# Altium footprint library Austindetz_CM4_Board_v1.0.PcbLib: 102 footprints (part 3 of 7)
Each footprint in its own frame and in the unit in brackets; x right, y up, seen from the top. Pads: shape width x height; smd on the part's side, far side on the other; paste and mask are expansions set on the pad; w line width, h text height; cw(c..) or ccw(c..) is an arc to the next point about the centre after c.
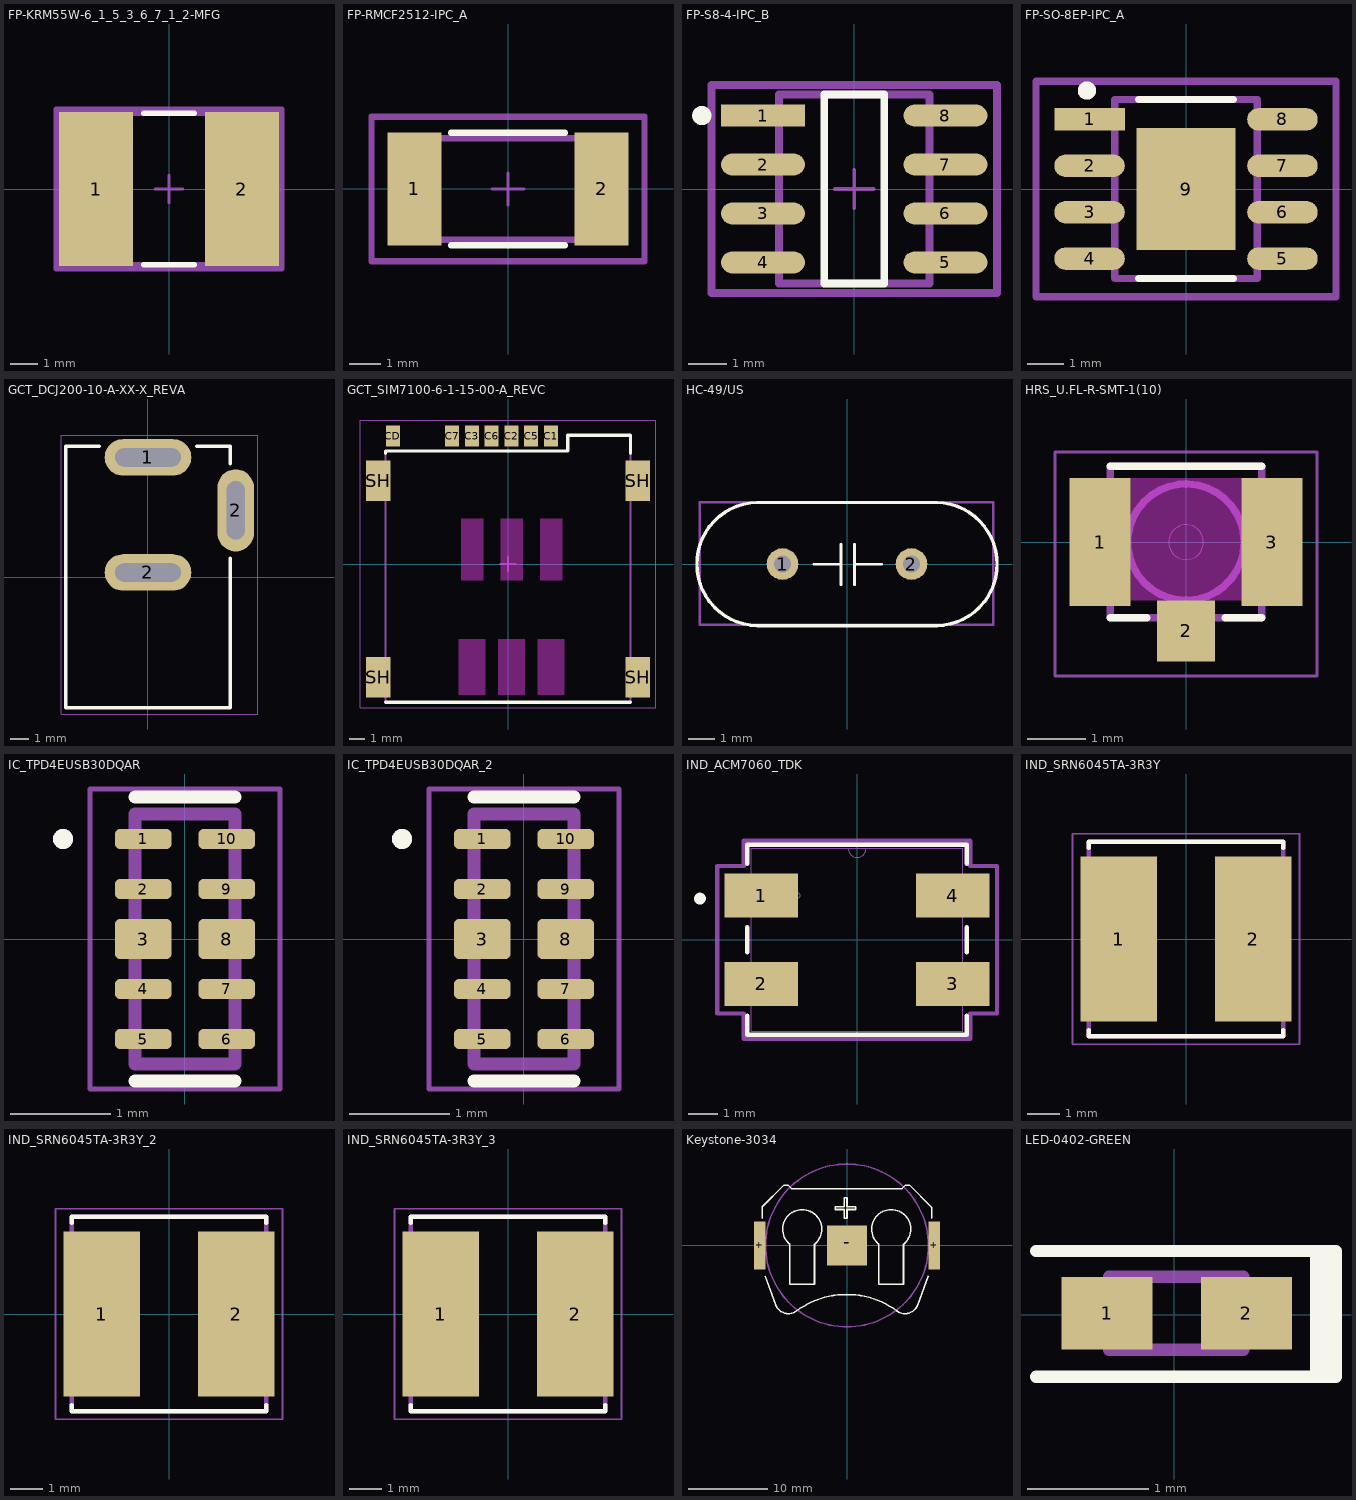
[diagram p2: the footprints below, top view; thin cyan lines are the x and y axes]

## FP-KRM55W-6_1_5_3_6_7_1_2-MFG [mm]
pads (2):
  rect 2.7x5.6 smd paste+0 mask+0: 1(-2.65,0) 2(2.65,0)
Top Overlay:
  lines w0.2: -0.925,-2.75 0.925,-2.75 ; -0.925,2.75 0.925,2.75
Top 3D Body:
  lines w0.2: -3.25,-2.75 -3.25,2.75 3.25,2.75 3.25,-2.75 -3.25,-2.75
Top Assembly:
  lines w0.2: -4.1,-2.9 -4.1,2.9 4.1,2.9 4.1,-2.9 -4.1,-2.9
  text ".Designator" at 0,0.188 h1
Top Courtyard:
  lines w0.2: -4.1,-2.9 -4.1,2.9 4.1,2.9 4.1,-2.9 -4.1,-2.9
Top Component Center:
  lines w0.1: -0.5,0 0.5,0 ; 0,-0.5 0,0.5
3D body "Cap_Murata_KRM55WR72A226MH01L_eec.STEP": height 6.7, standoff 0, extent -3.05,-2.65 3.05,2.65

## FP-RMCF2512-IPC_A [mm]
pads (2):
  rect 1.704x3.555 smd paste+0 mask+0: 1(-2.951,0) 2(2.951,0)
Top Overlay:
  lines w0.2: -1.799,-1.777 1.799,-1.777 ; -1.799,1.777 1.799,1.777
Top 3D Body:
  lines w0.2: -3.15,-1.6 -3.15,1.6 3.15,1.6 3.15,-1.6 -3.15,-1.6
Top Assembly:
  lines w0.2: -4.303,-2.277 -4.303,2.277 4.303,2.277 4.303,-2.277 -4.303,-2.277
  text ".Designator" at 0,0.188 h1
Top Courtyard:
  lines w0.2: -4.303,-2.277 -4.303,2.277 4.303,2.277 4.303,-2.277 -4.303,-2.277
Top Component Center:
  lines w0.1: -0.5,0 0.5,0 ; 0,-0.5 0,0.5
3D body "Res_Stackpole_RMCF2512FT10M0_eec.STEP": height 0.25, standoff 0, extent -4.303,-2.277 4.303,2.277

## FP-S8-4-IPC_B [mm]
pads (8):
  rect 2.174x0.567 smd paste+0 mask+0: 1(-2.366,1.905)
  rrect100% 2.174x0.567 smd paste+0 mask+0: 2(-2.366,0.635) 3(-2.366,-0.635) 4(-2.366,-1.905) 5(2.366,-1.905) 6(2.366,-0.635) 7(2.366,0.635) 8(2.366,1.905)
Top Overlay:
  circle w0.25: c-3.953,1.905 r0.125
  lines w0.2: -0.779,-2.45 0.779,-2.45 0.779,2.45 -0.779,2.45 -0.779,-2.45
Top 3D Body:
  lines w0.2: -1.95,-2.45 1.95,-2.45 1.95,2.45 -1.95,2.45 -1.95,-2.45
Top Assembly:
  lines w0.2: -3.703,-2.7 3.703,-2.7 3.703,2.7 -3.703,2.7 -3.703,-2.7
  text ".Designator" at 0,0.188 h1
Top Courtyard:
  lines w0.2: -3.703,-2.7 3.703,-2.7 3.703,2.7 -3.703,2.7 -3.703,-2.7
Top Component Center:
  lines w0.1: -0.5,0 0.5,0 ; 0,-0.5 0,0.5
3D body "IC_Maxim_MAX31855KASA+_eec.STEP": height 0.25, standoff 0, extent -3.703,-2.7 3.703,2.7

## FP-SO-8EP-IPC_A [mm]
pads (9):
  rect 1.93x0.612 smd paste+0 mask+0: 1(-2.641,1.905)
  rrect100% 1.93x0.612 smd paste+0 mask+0: 2(-2.641,0.635) 3(-2.641,-0.635) 4(-2.641,-1.905) 5(2.641,-1.905) 6(2.641,-0.635) 7(2.641,0.635) 8(2.641,1.905)
  rect 2.71x3.35 smd paste-1000 mask+0: 9(0,0)
Top Overlay:
  circle w0.25: c-2.712,2.694 r0.125
  lines w0.2: -1.301,-2.45 1.301,-2.45 ; -1.301,2.45 1.301,2.45
Top Paste:
  rectangle: -0.806,-1.126 0.806,1.126
Top 3D Body:
  lines w0.2: -1.95,-2.45 1.95,-2.45 1.95,2.45 -1.95,2.45 -1.95,-2.45
Top Assembly:
  lines w0.2: -4.106,-2.95 4.106,-2.95 4.106,2.95 -4.106,2.95 -4.106,-2.95
  text ".Designator" at 0,0 h1
Top Courtyard:
  lines w0.2: -4.106,-2.95 4.106,-2.95 4.106,2.95 -4.106,2.95 -4.106,-2.95
Top Component Center:
  lines w0.1: -0.5,0 0.5,0 ; 0,-0.5 0,0.5
3D body "IC_Diodes_Inc_AP6503SP-13_eec.STEP": height 1.63, standoff 0, extent -3,-2.45 3,2.45

## GCT_DCJ200-10-A-XX-X_REVA [mm]
pads (3):
  oval 4.75x2 hole 1 slot 3.6 at 0 deg unplated: 1(0,6.55) 2(0,0.25)
  oval 2x4.5 hole 1 slot 3.2 at 90 deg unplated: 2(4.8,3.65)
Top Overlay:
  lines w0.2: -2.685,7.15 -4.5,7.15 -4.5,-7.15 4.5,-7.15 4.5,1.016 ; 2.683,7.15 4.495,7.15 4.495,6.212
Mechanical 15:
  lines w0.05: -4.75,-7.5 -4.75,7.75 6,7.75 6,-7.5 -4.75,-7.5
3D body "step_temp.STEP": height 11, standoff -3.5, extent -4.5,-7.131 5.05,7.169

## GCT_SIM7100-6-1-15-00-A_REVC [mm]
pads (11):
  rect 0.9x1.35 smd: C1(2.755,8.215) C2(0.215,8.215) C3(-2.325,8.215) C5(1.485,8.215) C6(-1.055,8.215) C7(-3.595,8.215) CD(-7.405,8.215)
  rect 1.56x2.61 smd: SH(-8.34,-7.29) SH(-8.34,5.34) SH(8.34,-7.29) SH(8.34,5.34)
Top Overlay:
  lines w0.2: -7.875,-8.89 7.875,-8.89 ; -7.875,7.1 -7.875,7.27 3.84,7.27 3.84,8.28 7.875,8.28 7.875,7.1
Keep-Out Layer:
  region: 3.625,-8.41 1.925,-8.41 1.925,-4.83 3.625,-4.83
  region: 1.085,-8.41 -0.615,-8.41 -0.615,-4.83 1.085,-4.83
  region: -1.455,-8.41 -3.155,-8.41 -3.155,-4.83 -1.455,-4.83
  region: -1.605,-1.03 -3.005,-1.03 -3.005,2.91 -1.605,2.91
  region: 0.935,-1.03 -0.465,-1.03 -0.465,2.91 0.935,2.91
  region: 3.475,-1.03 2.075,-1.03 2.075,2.91 3.475,2.91
Mechanical 13:
  lines w0.1: -7.875,-8.89 7.875,-8.89 7.875,8.28 3.84,8.28 3.84,7.27 -7.875,7.27 -7.875,-8.89
Mechanical 15:
  lines w0.05: -9.5,-9.25 9.5,-9.25 9.5,9.25 -9.5,9.25 -9.5,-9.25
  lines w0.1: -0.5,0 0.5,0 ; 0,-0.5 0,0.5
3D body "SIM7100-6-1-15-00-A--3DModel-STEP-56544.STEP": height 1.5, standoff -0.03, extent -8.375,-8.919 8.375,8.411

## HC-49/US [mm]
pads (2):
  round 1.2 hole 0.63: 1(-2.44,0) 2(2.44,0)
Top Overlay:
  lines w0.1: -1.246,-0.014 -0.225,-0.014 ; -0.225,-0.78 -0.225,0.752 ; 0.286,-0.779 0.286,0.754 ; 0.286,-0.013 1.308,-0.013
  lines w0.127: -5.675,-0.021 cw(c-3.365,0.019) -3.405,2.329 ; -5.675,0.019 ccw(c-3.366,-0.021) -3.406,-2.33 ; -3.366,-2.33 3.372,-2.33 ; -3.365,2.33 3.359,2.33 ; 3.4,2.33 cw(c3.359,0.014) 5.675,-0.026 ; 3.412,-2.329 ccw(c3.372,-0.026) 5.675,0.014
Top Assembly:
  lines w0.1: -5.571,-2.299 5.527,-2.299 5.527,2.332 -5.571,2.332 -5.571,-2.299
  text "'.Designator'" at -0.388,-0.433 h1.27
3D body "CRYSTAL_192MIL.STEP": height 3.5, standoff -1.3, extent -5.525,-2.299 5.525,2.351

## HRS_U.FL-R-SMT-1(10) [mm]
pads (3):
  rect 1.05x2.2 smd: 1(-1.475,0) 3(1.475,0)
  rect 1x1.05 smd: 2(0,-1.525)
Top Overlay:
  lines w0.127: -1.3,-1.3 -0.67,-1.3 ; -1.3,1.3 1.3,1.3 ; 0.67,-1.3 1.3,-1.3
Keep-Out Layer:
  region: 0.95,-1 -0.95,-1 -0.95,1.1 0.95,1.1
Mechanical 13:
  circle w0.127: c0,0 r1
  circle w0: c0,0 r0.3
  lines w0.127: -1.3,-1.3 1.3,-1.3 1.3,1.3 -1.3,1.3 -1.3,-1.3
Mechanical 15:
  lines w0.05: -2.25,-2.3 2.25,-2.3 2.25,1.55 -2.25,1.55 -2.25,-2.3
3D body "U.FL-R-SMT-1(10)--3DModel-STEP-56544.STEP": height 1.26, standoff 0.01, extent -1.5,-1.677 1.5,1.423

## IC_TPD4EUSB30DQAR [mm]
height 13.32
pads (10):
  rrect50% 0.565x0.2 smd mask+0: 1(-0.417,1) 2(-0.417,0.5) 4(-0.417,-0.5) 5(-0.417,-1) 6(0.417,-1) 7(0.417,-0.5) 9(0.417,0.5) 10(0.417,1)
  rrect25% 0.565x0.4 smd paste-1 mask+0: 3(-0.417,0) 8(0.417,0)
Top Overlay:
  circle w0.1: c-1.22,1 r0.05
  lines w0.127: -0.5,-1.42 0.5,-1.42 ; -0.5,1.42 0.5,1.42
Top Paste:
  drawing of 2 lines, arcs and shapes, not listed
Top Solder:
  region: -0.065,0.83 -0.77,0.83 -0.77,1.17 -0.065,1.17
  region: -0.065,0.33 -0.77,0.33 -0.77,0.67 -0.065,0.67
  region: -0.065,-0.67 -0.77,-0.67 -0.77,-0.33 -0.065,-0.33
  region: -0.065,-1.17 -0.77,-1.17 -0.77,-0.83 -0.065,-0.83
  region: 0.77,0.83 0.065,0.83 0.065,1.17 0.77,1.17
  region: 0.77,0.33 0.065,0.33 0.065,0.67 0.77,0.67
  region: 0.77,-0.67 0.065,-0.67 0.065,-0.33 0.77,-0.33
  region: 0.77,-1.17 0.065,-1.17 0.065,-0.83 0.77,-0.83
  region: -0.065,-0.27 -0.77,-0.27 -0.77,0.27 -0.065,0.27
  region: 0.77,-0.27 0.065,-0.27 0.065,0.27 0.77,0.27
Mechanical 13:
  circle w0.1: c-1.22,1 r0.05
  lines w0.127: -0.5,-1.25 0.5,-1.25 0.5,1.25 -0.5,1.25 -0.5,-1.25
Mechanical 15:
  lines w0.05: -0.95,-1.5 0.95,-1.5 0.95,1.5 -0.95,1.5 -0.95,-1.5
3D body: height 0.5, standoff 0, extent -0.499,-1.249 0.499,1.249

## IC_TPD4EUSB30DQAR_2 [mm]
pads (10):
  rrect50% 0.565x0.2 smd mask+0: 1(-0.417,1) 2(-0.417,0.5) 4(-0.417,-0.5) 5(-0.417,-1) 6(0.417,-1) 7(0.417,-0.5) 9(0.417,0.5) 10(0.417,1)
  rrect25% 0.565x0.4 smd paste-1 mask+0: 3(-0.417,0) 8(0.417,0)
Top Overlay:
  circle w0.1: c-1.22,1 r0.05
  lines w0.127: -0.5,-1.42 0.5,-1.42 ; -0.5,1.42 0.5,1.42
Top Paste:
  drawing of 2 lines, arcs and shapes, not listed
Top Solder:
  region: 0.77,-0.27 0.065,-0.27 0.065,0.27 0.77,0.27
  region: -0.065,-0.27 -0.77,-0.27 -0.77,0.27 -0.065,0.27
  region: 0.77,-1.17 0.065,-1.17 0.065,-0.83 0.77,-0.83
  region: 0.77,-0.67 0.065,-0.67 0.065,-0.33 0.77,-0.33
  region: 0.77,0.33 0.065,0.33 0.065,0.67 0.77,0.67
  region: 0.77,0.83 0.065,0.83 0.065,1.17 0.77,1.17
  region: -0.065,-1.17 -0.77,-1.17 -0.77,-0.83 -0.065,-0.83
  region: -0.065,-0.67 -0.77,-0.67 -0.77,-0.33 -0.065,-0.33
  region: -0.065,0.33 -0.77,0.33 -0.77,0.67 -0.065,0.67
  region: -0.065,0.83 -0.77,0.83 -0.77,1.17 -0.065,1.17
Mechanical 13:
  circle w0.1: c-1.22,1 r0.05
  lines w0.127: -0.5,-1.25 -0.5,1.25 0.5,1.25 0.5,-1.25 -0.5,-1.25
Mechanical 15:
  lines w0.05: -0.95,-1.5 -0.95,1.5 0.95,1.5 0.95,-1.5 -0.95,-1.5
3D body: height 0.5, standoff 0, extent -0.499,-1.249 0.499,1.249

## IND_ACM7060_TDK [mm]
height 3.31
pads (4):
  rect 2.489x1.499 smd paste-0.749 mask+0: 1(-3.25,1.5) 2(-3.25,-1.5) 3(3.25,-1.5) 4(3.25,1.5)
Top Overlay:
  circle w0.2: c-5.334,1.397 r0.1
  lines w0.152: -3.721,-2.582 -3.721,-3.226 3.721,-3.226 3.721,-2.582 ; -3.721,-0.418 -3.721,0.418 ; -3.721,2.582 -3.721,3.226 3.721,3.226 3.721,2.582 ; 3.721,-0.418 3.721,0.418
Mechanical 13:
  circle w0: c-2.005,1.5 r0.076
  lines w0: -0.305,3.099 ccw(c0,3.099) 0.305,3.099
  lines w0.025: -3.594,-3.099 3.594,-3.099 3.594,3.099 -3.594,3.099 -3.594,-3.099
Mechanical 15:
  lines w0.152: -4.749,-2.503 -4.749,2.503 -3.848,2.503 -3.848,3.353 3.848,3.353 3.848,2.503 4.749,2.503 4.749,-2.503 3.848,-2.503 3.848,-3.353 -3.848,-3.353 -3.848,-2.503 -4.749,-2.503

## IND_SRN6045TA-3R3Y [mm]
height 1.6
pads (2):
  rect 2.35x5.1 smd: 1(-2.075,0) 2(2.075,0)
Top Overlay:
  lines w0.127: -3,-2.8 -3,-3 3,-3 3,-2.8 ; -3,2.8 -3,3 3,3 3,2.8
Mechanical 13:
  lines w0.127: -3,-3 -3,3 3,3 3,-3 -3,-3
Mechanical 15:
  lines w0.05: -3.5,-3.25 -3.5,3.25 3.5,3.25 3.5,-3.25 -3.5,-3.25
3D body: height 4.2, standoff 0, extent -3.429,-2.667 3.429,2.667

## IND_SRN6045TA-3R3Y_2 [mm]
pads (2):
  rect 2.35x5.1 smd: 1(-2.075,0) 2(2.075,0)
Top Overlay:
  lines w0.127: -3,-2.8 -3,-3 3,-3 3,-2.8 ; -3,2.8 -3,3 3,3 3,2.8
Mechanical 13:
  lines w0.127: -3,-3 -3,3 3,3 3,-3 -3,-3
Mechanical 15:
  lines w0.05: -3.5,-3.25 -3.5,3.25 3.5,3.25 3.5,-3.25 -3.5,-3.25
3D body: height 4.2, standoff 0, extent -3.429,-2.667 3.429,2.667

## IND_SRN6045TA-3R3Y_3 [mm]
pads (2):
  rect 2.35x5.1 smd: 1(-2.075,0) 2(2.075,0)
Top Overlay:
  lines w0.127: -3,-2.8 -3,-3 3,-3 3,-2.8 ; -3,2.8 -3,3 3,3 3,2.8
Mechanical 13:
  lines w0.127: -3,-3 3,-3 3,3 -3,3 -3,-3
Mechanical 15:
  lines w0.05: -3.5,-3.25 3.5,-3.25 3.5,3.25 -3.5,3.25 -3.5,-3.25
3D body: height 4.2, standoff 0, extent -3.429,-2.667 3.429,2.667

## Keystone-3034 [mm]
pads (3):
  rect 1.5x6 smd: +(-10.985,0) +(10.985,0)
  rect 5x5 smd: -(0,0)
Top Overlay:
  lines w0.2: -10.67,3.41 -10.67,4.858 -7.932,7.595 -7.429,7.595 -6.989,7.155 6.917,7.155 7.357,7.595 7.86,7.595 10.67,4.786 10.67,3.41 ; -10.314,-3.881 -8.97,-7.475 ccw(c-7.376,-6.879) -6.366,-8.249 cw(c-0.036,-16.836) 6.294,-8.249 ccw(c7.304,-6.879) 8.898,-7.475 10.25,-3.858 ; -7.186,-4.898 -7.186,0.164 ; -4.087,-4.898 -4.087,0.164 ; 4.015,-4.898 4.015,0.164 ; 7.114,-4.898 7.114,0.164 ; -7.211,-4.898 -4.062,-4.898 -4.062,0.164 ccw(c-5.637,2.052) -7.211,0.164 -7.211,-4.898 ; -1.465,4.522 -0.342,4.522 -0.342,3.398 0,3.398 0,4.522 1.123,4.522 1.123,4.864 0,4.864 0,5.987 -0.342,5.987 -0.342,4.864 -1.465,4.864 -1.465,4.522 ; 3.99,-4.898 3.99,0.164 cw(c5.565,2.054) 7.14,0.164 7.14,-4.898 3.99,-4.898
Top Assembly:
  circle w0.2: c0,0 r10.25
  text "'.Designator'" at -0.453,1.742 h2
3D body "User Library-keystone-PN3034.STEP": height 4.05, standoff -0.01, extent -11.62,-8.729 11.621,7.75

## LED-0402-GREEN [mm]
height 1.3
pads (2):
  rect 0.75x0.6 smd: 1(-0.556,0.014) 2(0.594,0.014)
Top Overlay:
  lines w0.1: -1.142,-0.51 1.259,-0.51 1.259,0.526 ; -1.142,0.526 1.259,0.526 ; 1.169,0.516 1.169,-0.511 1.332,-0.51 1.332,0.526 1.259,0.526
Top Assembly:
  lines w0.1: -0.539,-0.287 0.568,-0.287 0.568,0.315 -0.539,0.315 -0.539,-0.287
  text "'.Designator'" at -2.951,-1.606 h1.27
3D body "ChipLedWith-Green.stp": height 0.16, standoff 0, extent -0.502,-0.252 0.502,0.252